# Altium schematic symbol library WR-TBL_Pluggable PCB Header.SchLib: 719 symbols (part 4 of 5) (continued)
## 691356310010B
designator P?
WR-TBL Serie 356B Double Level Horizontal PCB Header, Pluggable, pitch 3.81mm, 10p; Part Number: 691356310010B; Compliance: RoHS; Modularity: No; Pin Number: 10; Rated Current [UL]: 10A; Working Voltage [UL]: 300VAC; ComponentLink1Description: Manufacturer; ComponentLink1URL: http://www.we-online.de; ComponentLink2URL: https://katalog.we-online.de/em/datasheet/691356310010B.pdf; ComponentLink2Description: Datasheet; Mounting Technology: THT; Packaging: Box; Operating Temperature: -40 to +105degC; PCB/Cable/Panel: PCB; Pitch: 3.81mm; Published Date: October 2019; Type: Double Level Horizontal; Publisher: Wurth Elektronik; Application: Pluggable
footprint 691356310010B
pins: 1, 2, 3, 4, 5, 6, 7, 8, 9, 10

## 691356310012B
designator P?
WR-TBL Serie 356B Double Level Horizontal PCB Header, Pluggable, pitch 3.81mm, 12p; Part Number: 691356310012B; Compliance: RoHS; Modularity: No; Pin Number: 12; Rated Current [UL]: 10A; Working Voltage [UL]: 300VAC; ComponentLink1Description: Manufacturer; ComponentLink1URL: http://www.we-online.de; ComponentLink2URL: https://katalog.we-online.de/em/datasheet/691356310012B.pdf; ComponentLink2Description: Datasheet; Mounting Technology: THT; Packaging: Box; Operating Temperature: -40 to +105degC; PCB/Cable/Panel: PCB; Pitch: 3.81mm; Published Date: October 2019; Type: Double Level Horizontal; Publisher: Wurth Elektronik; Application: Pluggable
footprint 691356310012B
pins: 1, 2, 3, 4, 5, 6, 7, 8, 9, 10, 11, 12

## 691357300004B
designator P?
WR-TBL Serie 357B Double Level Vertical PCB Header with Flanges, Pluggable, pitch 3.81mm, 4p; Part Number: 691357300004B; Compliance: RoHS; Modularity: No; Pin Number: 4; Rated Current [UL]: 10A; Working Voltage [UL]: 300VAC; ComponentLink1Description: Manufacturer; ComponentLink1URL: http://www.we-online.de; ComponentLink2URL: https://katalog.we-online.de/em/datasheet/691357300004B.pdf; ComponentLink2Description: Datasheet; Mounting Technology: THT; Packaging: Box; Operating Temperature: -40 to +105degC; PCB/Cable/Panel: PCB; Pitch: 3.81mm; Published Date: October 2019; Type: Double Level Vertical; Publisher: Wurth Elektronik; Application: Pluggable
footprint 691357300004B
pins: 1, 2, 3, 4

## 691357300006B
designator P?
WR-TBL Serie 357B Double Level Vertical PCB Header with Flanges, Pluggable, pitch 3.81mm, 6p; Part Number: 691357300006B; Compliance: RoHS; Modularity: No; Pin Number: 6; Rated Current [UL]: 10A; Working Voltage [UL]: 300VAC; ComponentLink1Description: Manufacturer; ComponentLink1URL: http://www.we-online.de; ComponentLink2URL: https://katalog.we-online.de/em/datasheet/691357300006B.pdf; ComponentLink2Description: Datasheet; Mounting Technology: THT; Packaging: Box; Operating Temperature: -40 to +105degC; PCB/Cable/Panel: PCB; Pitch: 3.81mm; Published Date: October 2019; Type: Double Level Vertical; Publisher: Wurth Elektronik; Application: Pluggable
footprint 691357300006B
pins: 1, 2, 3, 4, 5, 6

## 691357300008B
designator P?
WR-TBL Serie 357B Double Level Vertical PCB Header with Flanges, Pluggable, pitch 3.81mm, 8p; Part Number: 691357300008B; Compliance: RoHS; Modularity: No; Pin Number: 8; Rated Current [UL]: 10A; Working Voltage [UL]: 300VAC; ComponentLink1Description: Manufacturer; ComponentLink1URL: http://www.we-online.de; ComponentLink2URL: https://katalog.we-online.de/em/datasheet/691357300008B.pdf; ComponentLink2Description: Datasheet; Mounting Technology: THT; Packaging: Box; Operating Temperature: -40 to +105degC; PCB/Cable/Panel: PCB; Pitch: 3.81mm; Published Date: October 2019; Type: Double Level Vertical; Publisher: Wurth Elektronik; Application: Pluggable
footprint 691357300008B
pins: 1, 2, 3, 4, 5, 6, 7, 8

## 691357300010B
designator P?
WR-TBL Serie 357B Double Level Vertical PCB Header with Flanges, Pluggable, pitch 3.81mm, 10p; Part Number: 691357300010B; Compliance: RoHS; Modularity: No; Pin Number: 10; Rated Current [UL]: 10A; Working Voltage [UL]: 300VAC; ComponentLink1Description: Manufacturer; ComponentLink1URL: http://www.we-online.de; ComponentLink2URL: https://katalog.we-online.de/em/datasheet/691357300010B.pdf; ComponentLink2Description: Datasheet; Mounting Technology: THT; Packaging: Box; Operating Temperature: -40 to +105degC; PCB/Cable/Panel: PCB; Pitch: 3.81mm; Published Date: October 2019; Type: Double Level Vertical; Publisher: Wurth Elektronik; Application: Pluggable
footprint 691357300010B
pins: 1, 2, 3, 4, 5, 6, 7, 8, 9, 10

## 691357300012B
designator P?
WR-TBL Serie 357B Double Level Vertical PCB Header with Flanges, Pluggable, pitch 3.81mm, 12p; Part Number: 691357300012B; Compliance: RoHS; Modularity: No; Pin Number: 12; Rated Current [UL]: 10A; Working Voltage [UL]: 300VAC; ComponentLink1Description: Manufacturer; ComponentLink1URL: http://www.we-online.de; ComponentLink2URL: https://katalog.we-online.de/em/datasheet/691357300012B.pdf; ComponentLink2Description: Datasheet; Mounting Technology: THT; Packaging: Box; Operating Temperature: -40 to +105degC; PCB/Cable/Panel: PCB; Pitch: 3.81mm; Published Date: October 2019; Type: Double Level Vertical; Publisher: Wurth Elektronik; Application: Pluggable
footprint 691357300012B
pins: 1, 2, 3, 4, 5, 6, 7, 8, 9, 10, 11, 12

## 691357310004B
designator P?
WR-TBL Serie 357B Double Level Horizontal PCB Header with Flanges, Pluggable, pitch 3.81mm, 4p; Part Number: 691357310004B; Compliance: RoHS; Modularity: No; Pin Number: 4; Rated Current [UL]: 10A; Working Voltage [UL]: 300VAC; ComponentLink1Description: Manufacturer; ComponentLink1URL: http://www.we-online.de; ComponentLink2URL: https://katalog.we-online.de/em/datasheet/691357310004B.pdf; ComponentLink2Description: Datasheet; Mounting Technology: THT; Packaging: Box; Operating Temperature: -40 to +105degC; PCB/Cable/Panel: PCB; Pitch: 3.81mm; Published Date: October 2019; Type: Double Level Horizontal; Publisher: Wurth Elektronik; Application: Pluggable
footprint 691357310004B
pins: 1, 2, 3, 4

## 691357310006B
designator P?
WR-TBL Serie 357B Double Level Horizontal PCB Header with Flanges, Pluggable, pitch 3.81mm, 6p; Part Number: 691357310006B; Compliance: RoHS; Modularity: No; Pin Number: 6; Rated Current [UL]: 10A; Working Voltage [UL]: 300VAC; ComponentLink1Description: Manufacturer; ComponentLink1URL: http://www.we-online.de; ComponentLink2URL: https://katalog.we-online.de/em/datasheet/691357310006B.pdf; ComponentLink2Description: Datasheet; Mounting Technology: THT; Packaging: Box; Operating Temperature: -40 to +105degC; PCB/Cable/Panel: PCB; Pitch: 3.81mm; Published Date: October 2019; Type: Double Level Horizontal; Publisher: Wurth Elektronik; Application: Pluggable
footprint 691357310006B
pins: 1, 2, 3, 4, 5, 6

## 691357310008B
designator P?
WR-TBL Serie 357B Double Level Horizontal PCB Header with Flanges, Pluggable, pitch 3.81mm, 8p; Part Number: 691357310008B; Compliance: RoHS; Modularity: No; Pin Number: 8; Rated Current [UL]: 10A; Working Voltage [UL]: 300VAC; ComponentLink1Description: Manufacturer; ComponentLink1URL: http://www.we-online.de; ComponentLink2URL: https://katalog.we-online.de/em/datasheet/691357310008B.pdf; ComponentLink2Description: Datasheet; Mounting Technology: THT; Packaging: Box; Operating Temperature: -40 to +105degC; PCB/Cable/Panel: PCB; Pitch: 3.81mm; Published Date: October 2019; Type: Double Level Horizontal; Publisher: Wurth Elektronik; Application: Pluggable
footprint 691357310008B
pins: 1, 2, 3, 4, 5, 6, 7, 8

## 691357310010B
designator P?
WR-TBL Serie 357B Double Level Horizontal PCB Header with Flanges, Pluggable, pitch 3.81mm, 10p; Part Number: 691357310010B; Compliance: RoHS; Modularity: No; Pin Number: 10; Rated Current [UL]: 10A; Working Voltage [UL]: 300VAC; ComponentLink1Description: Manufacturer; ComponentLink1URL: http://www.we-online.de; ComponentLink2URL: https://katalog.we-online.de/em/datasheet/691357310010B.pdf; ComponentLink2Description: Datasheet; Mounting Technology: THT; Packaging: Box; Operating Temperature: -40 to +105degC; PCB/Cable/Panel: PCB; Pitch: 3.81mm; Published Date: October 2019; Type: Double Level Horizontal; Publisher: Wurth Elektronik; Application: Pluggable
footprint 691357310010B
pins: 1, 2, 3, 4, 5, 6, 7, 8, 9, 10

## 691357310012B
designator P?
WR-TBL Serie 357B Double Level Horizontal PCB Header with Flanges, Pluggable, pitch 3.81mm, 12p; Part Number: 691357310012B; Compliance: RoHS; Modularity: No; Pin Number: 12; Rated Current [UL]: 10A; Working Voltage [UL]: 300VAC; ComponentLink1Description: Manufacturer; ComponentLink1URL: http://www.we-online.de; ComponentLink2URL: https://katalog.we-online.de/em/datasheet/691357310012B.pdf; ComponentLink2Description: Datasheet; Mounting Technology: THT; Packaging: Box; Operating Temperature: -40 to +105degC; PCB/Cable/Panel: PCB; Pitch: 3.81mm; Published Date: October 2019; Type: Double Level Horizontal; Publisher: Wurth Elektronik; Application: Pluggable
footprint 691357310012B
pins: 1, 2, 3, 4, 5, 6, 7, 8, 9, 10, 11, 12

## 691370710002B
designator P?
WR-TBL Serie 370B Horizontal PCB Header, Pluggable, pitch 5mm, 2p; Part Number: 691370710002B; Compliance: RoHS; Modularity: No; Pin Number: 2; Rated Current [UL]: 16A; Working Voltage [UL]: 300VAC; ComponentLink1Description: Manufacturer; ComponentLink1URL: http://www.we-online.de; ComponentLink2URL: https://katalog.we-online.de/em/datasheet/691370710002B.pdf; ComponentLink2Description: Datasheet; Mounting Technology: THT; Packaging: Box; Operating Temperature: -40 to +105degC; PCB/Cable/Panel: PCB; Pitch: 5mm; Published Date: October 2019; Type: Horizontal; Publisher: Wurth Elektronik; Application: Pluggable
footprint 691370710002B
pins: 1, 2

## 691370710003B
designator P?
WR-TBL Serie 370B Horizontal PCB Header, Pluggable, pitch 5mm, 3p; Part Number: 691370710003B; Compliance: RoHS; Modularity: No; Pin Number: 3; Rated Current [UL]: 16A; Working Voltage [UL]: 300VAC; ComponentLink1Description: Manufacturer; ComponentLink1URL: http://www.we-online.de; ComponentLink2URL: https://katalog.we-online.de/em/datasheet/691370710003B.pdf; ComponentLink2Description: Datasheet; Mounting Technology: THT; Packaging: Box; Operating Temperature: -40 to +105degC; PCB/Cable/Panel: PCB; Pitch: 5mm; Published Date: October 2019; Type: Horizontal; Publisher: Wurth Elektronik; Application: Pluggable
footprint 691370710003B
pins: 1, 2, 3

## 691370710004B
designator P?
WR-TBL Serie 370B Horizontal PCB Header, Pluggable, pitch 5mm, 4p; Part Number: 691370710004B; Compliance: RoHS; Modularity: No; Pin Number: 4; Rated Current [UL]: 16A; Working Voltage [UL]: 300VAC; ComponentLink1Description: Manufacturer; ComponentLink1URL: http://www.we-online.de; ComponentLink2URL: https://katalog.we-online.de/em/datasheet/691370710004B.pdf; ComponentLink2Description: Datasheet; Mounting Technology: THT; Packaging: Box; Operating Temperature: -40 to +105degC; PCB/Cable/Panel: PCB; Pitch: 5mm; Published Date: October 2019; Type: Horizontal; Publisher: Wurth Elektronik; Application: Pluggable
footprint 691370710004B
pins: 1, 2, 3, 4

## 691370710005B
designator P?
WR-TBL Serie 370B Horizontal PCB Header, Pluggable, pitch 5mm, 5p; Part Number: 691370710005B; Compliance: RoHS; Modularity: No; Pin Number: 5; Rated Current [UL]: 16A; Working Voltage [UL]: 300VAC; ComponentLink1Description: Manufacturer; ComponentLink1URL: http://www.we-online.de; ComponentLink2URL: https://katalog.we-online.de/em/datasheet/691370710005B.pdf; ComponentLink2Description: Datasheet; Mounting Technology: THT; Packaging: Box; Operating Temperature: -40 to +105degC; PCB/Cable/Panel: PCB; Pitch: 5mm; Published Date: October 2019; Type: Horizontal; Publisher: Wurth Elektronik; Application: Pluggable
footprint 691370710005B
pins: 1, 2, 3, 4, 5

## 691370710006B
designator P?
WR-TBL Serie 370B Horizontal PCB Header, Pluggable, pitch 5mm, 6p; Part Number: 691370710006B; Compliance: RoHS; Modularity: No; Pin Number: 6; Rated Current [UL]: 16A; Working Voltage [UL]: 300VAC; ComponentLink1Description: Manufacturer; ComponentLink1URL: http://www.we-online.de; ComponentLink2URL: https://katalog.we-online.de/em/datasheet/691370710006B.pdf; ComponentLink2Description: Datasheet; Mounting Technology: THT; Packaging: Box; Operating Temperature: -40 to +105degC; PCB/Cable/Panel: PCB; Pitch: 5mm; Published Date: October 2019; Type: Horizontal; Publisher: Wurth Elektronik; Application: Pluggable
footprint 691370710006B
pins: 1, 2, 3, 4, 5, 6

## 691370710007B
designator P?
WR-TBL Serie 370B Horizontal PCB Header, Pluggable, pitch 5mm, 7p; Part Number: 691370710007B; Compliance: RoHS; Modularity: No; Pin Number: 7; Rated Current [UL]: 16A; Working Voltage [UL]: 300VAC; ComponentLink1Description: Manufacturer; ComponentLink1URL: http://www.we-online.de; ComponentLink2URL: https://katalog.we-online.de/em/datasheet/691370710007B.pdf; ComponentLink2Description: Datasheet; Mounting Technology: THT; Packaging: Box; Operating Temperature: -40 to +105degC; PCB/Cable/Panel: PCB; Pitch: 5mm; Published Date: October 2019; Type: Horizontal; Publisher: Wurth Elektronik; Application: Pluggable
footprint 691370710007B
pins: 1, 2, 3, 4, 5, 6, 7

## 691370710008B
designator P?
WR-TBL Serie 370B Horizontal PCB Header, Pluggable, pitch 5mm, 8p; Part Number: 691370710008B; Compliance: RoHS; Modularity: No; Pin Number: 8; Rated Current [UL]: 16A; Working Voltage [UL]: 300VAC; ComponentLink1Description: Manufacturer; ComponentLink1URL: http://www.we-online.de; ComponentLink2URL: https://katalog.we-online.de/em/datasheet/691370710008B.pdf; ComponentLink2Description: Datasheet; Mounting Technology: THT; Packaging: Box; Operating Temperature: -40 to +105degC; PCB/Cable/Panel: PCB; Pitch: 5mm; Published Date: October 2019; Type: Horizontal; Publisher: Wurth Elektronik; Application: Pluggable
footprint 691370710008B
pins: 1, 2, 3, 4, 5, 6, 7, 8

## 691370710012B
designator P?
WR-TBL Serie 370B Horizontal PCB Header, Pluggable, pitch 5mm, 12p; Part Number: 691370710012B; Compliance: RoHS; Modularity: No; Pin Number: 12; Rated Current [UL]: 16A; Working Voltage [UL]: 300VAC; ComponentLink1Description: Manufacturer; ComponentLink1URL: http://www.we-online.de; ComponentLink2URL: https://katalog.we-online.de/em/datasheet/691370710012B.pdf; ComponentLink2Description: Datasheet; Mounting Technology: THT; Packaging: Box; Operating Temperature: -40 to +105degC; PCB/Cable/Panel: PCB; Pitch: 5mm; Published Date: October 2019; Type: Horizontal; Publisher: Wurth Elektronik; Application: Pluggable
footprint 691370710012B
pins: 1, 2, 3, 4, 5, 6, 7, 8, 9, 10, 11, 12

## 691371700002B
designator P?
WR-TBL Serie 371B Vertical PCB Header, Pluggable, pitch 5mm, 2p; Part Number: 691371700002B; Compliance: RoHS; Modularity: No; Pin Number: 2; Rated Current [UL]: 16A; Working Voltage [UL]: 300VAC; ComponentLink1Description: Manufacturer; ComponentLink1URL: http://www.we-online.de; ComponentLink2URL: https://katalog.we-online.de/em/datasheet/691371700002B.pdf; ComponentLink2Description: Datasheet; Mounting Technology: THT; Packaging: Box; Operating Temperature: -40 to +105degC; PCB/Cable/Panel: PCB; Pitch: 5mm; Published Date: October 2019; Type: Vertical; Publisher: Wurth Elektronik; Application: Pluggable
footprint 691371700002B
pins: 1, 2

## 691371700003B
designator P?
WR-TBL Serie 371B Vertical PCB Header, Pluggable, pitch 5mm, 3p; Part Number: 691371700003B; Compliance: RoHS; Modularity: No; Pin Number: 3; Rated Current [UL]: 16A; Working Voltage [UL]: 300VAC; ComponentLink1Description: Manufacturer; ComponentLink1URL: http://www.we-online.de; ComponentLink2URL: https://katalog.we-online.de/em/datasheet/691371700003B.pdf; ComponentLink2Description: Datasheet; Mounting Technology: THT; Packaging: Box; Operating Temperature: -40 to +105degC; PCB/Cable/Panel: PCB; Pitch: 5mm; Published Date: October 2019; Type: Vertical; Publisher: Wurth Elektronik; Application: Pluggable
footprint 691371700003B
pins: 1, 2, 3

## 691371700004B
designator P?
WR-TBL Serie 371B Vertical PCB Header, Pluggable, pitch 5mm, 4p; Part Number: 691371700004B; Compliance: RoHS; Modularity: No; Pin Number: 4; Rated Current [UL]: 16A; Working Voltage [UL]: 300VAC; ComponentLink1Description: Manufacturer; ComponentLink1URL: http://www.we-online.de; ComponentLink2URL: https://katalog.we-online.de/em/datasheet/691371700004B.pdf; ComponentLink2Description: Datasheet; Mounting Technology: THT; Packaging: Box; Operating Temperature: -40 to +105degC; PCB/Cable/Panel: PCB; Pitch: 5mm; Published Date: October 2019; Type: Vertical; Publisher: Wurth Elektronik; Application: Pluggable
footprint 691371700004B
pins: 1, 2, 3, 4

## 691371700005B
designator P?
WR-TBL Serie 371B Vertical PCB Header, Pluggable, pitch 5mm, 5p; Part Number: 691371700005B; Compliance: RoHS; Modularity: No; Pin Number: 5; Rated Current [UL]: 16A; Working Voltage [UL]: 300VAC; ComponentLink1Description: Manufacturer; ComponentLink1URL: http://www.we-online.de; ComponentLink2URL: https://katalog.we-online.de/em/datasheet/691371700005B.pdf; ComponentLink2Description: Datasheet; Mounting Technology: THT; Packaging: Box; Operating Temperature: -40 to +105degC; PCB/Cable/Panel: PCB; Pitch: 5mm; Published Date: October 2019; Type: Vertical; Publisher: Wurth Elektronik; Application: Pluggable
footprint 691371700005B
pins: 1, 2, 3, 4, 5

## 691371700006B
designator P?
WR-TBL Serie 371B Vertical PCB Header, Pluggable, pitch 5mm, 6p; Part Number: 691371700006B; Compliance: RoHS; Modularity: No; Pin Number: 6; Rated Current [UL]: 16A; Working Voltage [UL]: 300VAC; ComponentLink1Description: Manufacturer; ComponentLink1URL: http://www.we-online.de; ComponentLink2URL: https://katalog.we-online.de/em/datasheet/691371700006B.pdf; ComponentLink2Description: Datasheet; Mounting Technology: THT; Packaging: Box; Operating Temperature: -40 to +105degC; PCB/Cable/Panel: PCB; Pitch: 5mm; Published Date: October 2019; Type: Vertical; Publisher: Wurth Elektronik; Application: Pluggable
footprint 691371700006B
pins: 1, 2, 3, 4, 5, 6

## 691371700007B
designator P?
WR-TBL Serie 371B Vertical PCB Header, Pluggable, pitch 5mm, 7p; Part Number: 691371700007B; Compliance: RoHS; Modularity: No; Pin Number: 7; Rated Current [UL]: 16A; Working Voltage [UL]: 300VAC; ComponentLink1Description: Manufacturer; ComponentLink1URL: http://www.we-online.de; ComponentLink2URL: https://katalog.we-online.de/em/datasheet/691371700007B.pdf; ComponentLink2Description: Datasheet; Mounting Technology: THT; Packaging: Box; Operating Temperature: -40 to +105degC; PCB/Cable/Panel: PCB; Pitch: 5mm; Published Date: October 2019; Type: Vertical; Publisher: Wurth Elektronik; Application: Pluggable
footprint 691371700007B
pins: 1, 2, 3, 4, 5, 6, 7

## 691371700008B
designator P?
WR-TBL Serie 371B Vertical PCB Header, Pluggable, pitch 5mm, 8p; Part Number: 691371700008B; Compliance: RoHS; Modularity: No; Pin Number: 8; Rated Current [UL]: 16A; Working Voltage [UL]: 300VAC; ComponentLink1Description: Manufacturer; ComponentLink1URL: http://www.we-online.de; ComponentLink2URL: https://katalog.we-online.de/em/datasheet/691371700008B.pdf; ComponentLink2Description: Datasheet; Mounting Technology: THT; Packaging: Box; Operating Temperature: -40 to +105degC; PCB/Cable/Panel: PCB; Pitch: 5mm; Published Date: October 2019; Type: Vertical; Publisher: Wurth Elektronik; Application: Pluggable
footprint 691371700008B
pins: 1, 2, 3, 4, 5, 6, 7, 8

## 691371700012B
designator P?
WR-TBL Serie 371B Vertical PCB Header, Pluggable, pitch 5mm, 12p; Part Number: 691371700012B; Compliance: RoHS; Modularity: No; Pin Number: 12; Rated Current [UL]: 16A; Working Voltage [UL]: 300VAC; ComponentLink1Description: Manufacturer; ComponentLink1URL: http://www.we-online.de; ComponentLink2URL: https://katalog.we-online.de/em/datasheet/691371700012B.pdf; ComponentLink2Description: Datasheet; Mounting Technology: THT; Packaging: Box; Operating Temperature: -40 to +105degC; PCB/Cable/Panel: PCB; Pitch: 5mm; Published Date: October 2019; Type: Vertical; Publisher: Wurth Elektronik; Application: Pluggable
footprint 691371700012B
pins: 1, 2, 3, 4, 5, 6, 7, 8, 9, 10, 11, 12

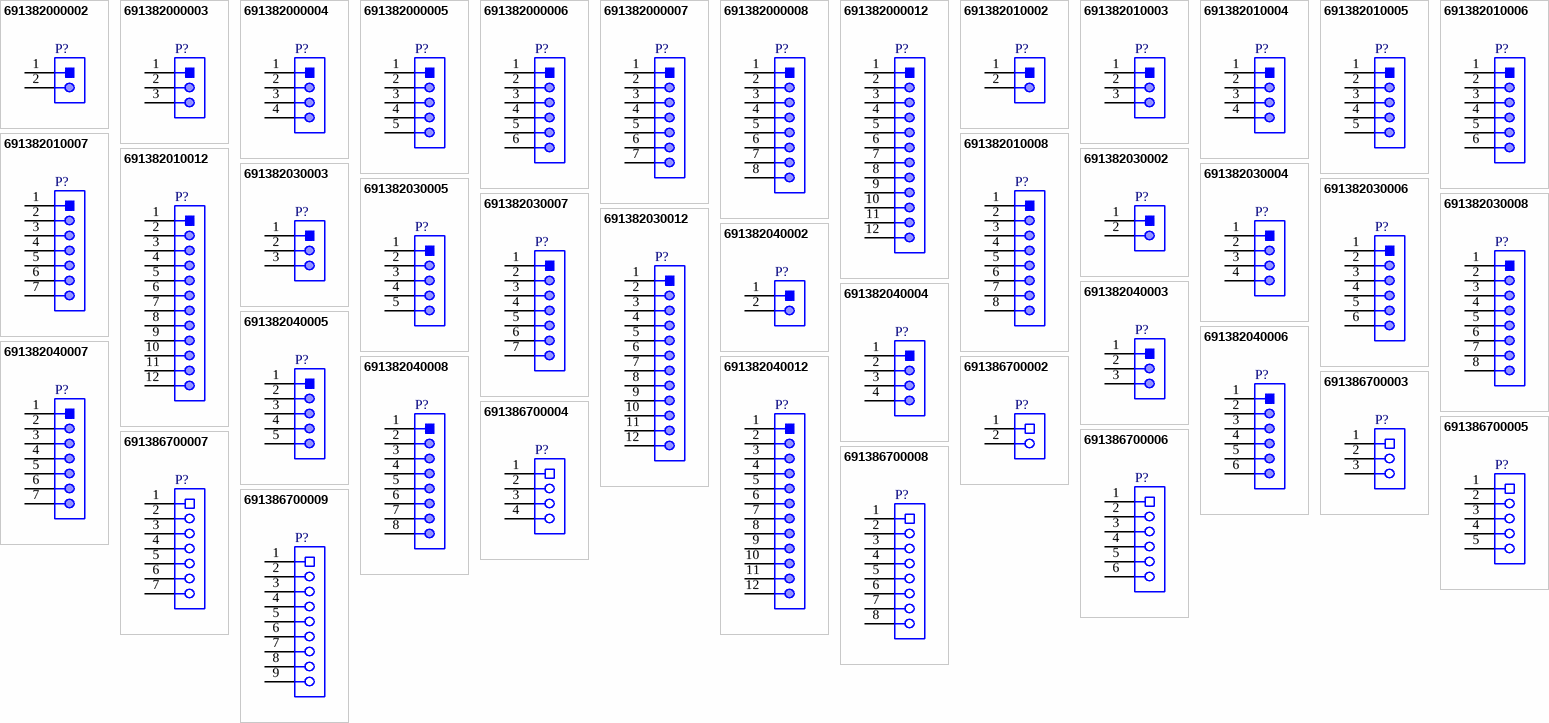
[diagram p14: symbols 691382000002 to 691386700009]

## 691382000002
designator P?
WR-TBL Serie 382 Vertical PCB Header, Pluggable, pitch 2.5mm, 2p; Part Number: 691382000002; Compliance: RoHS; Modularity: No; Pin Number: 2; Rated Current [UL]: 12A; Working Voltage [UL]: 300VAC; ComponentLink1Description: Manufacturer; ComponentLink1URL: http://www.we-online.de; ComponentLink2URL: https://katalog.we-online.de/em/datasheet/691382000002.pdf; ComponentLink2Description: Datasheet; Mounting Technology: THT; Packaging: Box; Operating Temperature: -40 to +105degC; PCB/Cable/Panel: PCB; Pitch: 2.5mm; Published Date: October 2019; Type: Vertical; Publisher: Wurth Elektronik; Application: Pluggable
footprint 691382000002
pins: 1, 2

## 691382000003
designator P?
WR-TBL Serie 382 Vertical PCB Header, Pluggable, pitch 2.5mm, 3p; Part Number: 691382000003; Compliance: RoHS; Modularity: No; Pin Number: 3; Rated Current [UL]: 12A; Working Voltage [UL]: 300VAC; ComponentLink1Description: Manufacturer; ComponentLink1URL: http://www.we-online.de; ComponentLink2URL: https://katalog.we-online.de/em/datasheet/691382000003.pdf; ComponentLink2Description: Datasheet; Mounting Technology: THT; Packaging: Box; Operating Temperature: -40 to +105degC; PCB/Cable/Panel: PCB; Pitch: 2.5mm; Published Date: October 2019; Type: Vertical; Publisher: Wurth Elektronik; Application: Pluggable
footprint 691382000003
pins: 1, 2, 3

## 691382000004
designator P?
WR-TBL Serie 382 Vertical PCB Header, Pluggable, pitch 2.5mm, 4p; Part Number: 691382000004; Compliance: RoHS; Modularity: No; Pin Number: 4; Rated Current [UL]: 12A; Working Voltage [UL]: 300VAC; ComponentLink1Description: Manufacturer; ComponentLink1URL: http://www.we-online.de; ComponentLink2URL: https://katalog.we-online.de/em/datasheet/691382000004.pdf; ComponentLink2Description: Datasheet; Mounting Technology: THT; Packaging: Box; Operating Temperature: -40 to +105degC; PCB/Cable/Panel: PCB; Pitch: 2.5mm; Published Date: October 2019; Type: Vertical; Publisher: Wurth Elektronik; Application: Pluggable
footprint 691382000004
pins: 1, 2, 3, 4

## 691382000005
designator P?
WR-TBL Serie 382 Vertical PCB Header, Pluggable, pitch 2.5mm, 5p; Part Number: 691382000005; Compliance: RoHS; Modularity: No; Pin Number: 5; Rated Current [UL]: 12A; Working Voltage [UL]: 300VAC; ComponentLink1Description: Manufacturer; ComponentLink1URL: http://www.we-online.de; ComponentLink2URL: https://katalog.we-online.de/em/datasheet/691382000005.pdf; ComponentLink2Description: Datasheet; Mounting Technology: THT; Packaging: Box; Operating Temperature: -40 to +105degC; PCB/Cable/Panel: PCB; Pitch: 2.5mm; Published Date: October 2019; Type: Vertical; Publisher: Wurth Elektronik; Application: Pluggable
footprint 691382000005
pins: 1, 2, 3, 4, 5

## 691382000006
designator P?
WR-TBL Serie 382 Vertical PCB Header, Pluggable, pitch 2.5mm, 6p; Part Number: 691382000006; Compliance: RoHS; Modularity: No; Pin Number: 6; Rated Current [UL]: 12A; Working Voltage [UL]: 300VAC; ComponentLink1Description: Manufacturer; ComponentLink1URL: http://www.we-online.de; ComponentLink2URL: https://katalog.we-online.de/em/datasheet/691382000006.pdf; ComponentLink2Description: Datasheet; Mounting Technology: THT; Packaging: Box; Operating Temperature: -40 to +105degC; PCB/Cable/Panel: PCB; Pitch: 2.5mm; Published Date: October 2019; Type: Vertical; Publisher: Wurth Elektronik; Application: Pluggable
footprint 691382000006
pins: 1, 2, 3, 4, 5, 6

## 691382000007
designator P?
WR-TBL Serie 382 Vertical PCB Header, Pluggable, pitch 2.5mm, 7p; Part Number: 691382000007; Compliance: RoHS; Modularity: No; Pin Number: 7; Rated Current [UL]: 12A; Working Voltage [UL]: 300VAC; ComponentLink1Description: Manufacturer; ComponentLink1URL: http://www.we-online.de; ComponentLink2URL: https://katalog.we-online.de/em/datasheet/691382000007.pdf; ComponentLink2Description: Datasheet; Mounting Technology: THT; Packaging: Box; Operating Temperature: -40 to +105degC; PCB/Cable/Panel: PCB; Pitch: 2.5mm; Published Date: October 2019; Type: Vertical; Publisher: Wurth Elektronik; Application: Pluggable
footprint 691382000007
pins: 1, 2, 3, 4, 5, 6, 7

## 691382000008
designator P?
WR-TBL Serie 382 Vertical PCB Header, Pluggable, pitch 2.5mm, 8p; Part Number: 691382000008; Compliance: RoHS; Modularity: No; Pin Number: 8; Rated Current [UL]: 12A; Working Voltage [UL]: 300VAC; ComponentLink1Description: Manufacturer; ComponentLink1URL: http://www.we-online.de; ComponentLink2URL: https://katalog.we-online.de/em/datasheet/691382000008.pdf; ComponentLink2Description: Datasheet; Mounting Technology: THT; Packaging: Box; Operating Temperature: -40 to +105degC; PCB/Cable/Panel: PCB; Pitch: 2.5mm; Published Date: October 2019; Type: Vertical; Publisher: Wurth Elektronik; Application: Pluggable
footprint 691382000008
pins: 1, 2, 3, 4, 5, 6, 7, 8

## 691382000012
designator P?
WR-TBL Serie 382 Vertical PCB Header, Pluggable, pitch 2.5mm, 12p; Part Number: 691382000012; Compliance: RoHS; Modularity: No; Pin Number: 12; Rated Current [UL]: 12A; Working Voltage [UL]: 300VAC; ComponentLink1Description: Manufacturer; ComponentLink1URL: http://www.we-online.de; ComponentLink2URL: https://katalog.we-online.de/em/datasheet/691382000012.pdf; ComponentLink2Description: Datasheet; Mounting Technology: THT; Packaging: Box; Operating Temperature: -40 to +105degC; PCB/Cable/Panel: PCB; Pitch: 2.5mm; Published Date: October 2019; Type: Vertical; Publisher: Wurth Elektronik; Application: Pluggable
footprint 691382000012
pins: 1, 2, 3, 4, 5, 6, 7, 8, 9, 10, 11, 12

## 691382010002
designator P?
WR-TBL Serie 382 Horizontal PCB Header, Pluggable, pitch 2.5mm, 2p; Part Number: 691382010002; Compliance: RoHS; Modularity: No; Pin Number: 2; Rated Current [UL]: 12A; Working Voltage [UL]: 300VAC; ComponentLink1Description: Manufacturer; ComponentLink1URL: http://www.we-online.de; ComponentLink2URL: https://katalog.we-online.de/em/datasheet/691382010002.pdf; ComponentLink2Description: Datasheet; Mounting Technology: THT; Packaging: Box; Operating Temperature: -40 to +105degC; PCB/Cable/Panel: PCB; Pitch: 2.5mm; Published Date: October 2019; Type: Horizontal; Publisher: Wurth Elektronik; Application: Pluggable
footprint 691382010002
pins: 1, 2

## 691382010003
designator P?
WR-TBL Serie 382 Horizontal PCB Header, Pluggable, pitch 2.5mm, 3p; Part Number: 691382010003; Compliance: RoHS; Modularity: No; Pin Number: 3; Rated Current [UL]: 12A; Working Voltage [UL]: 300VAC; ComponentLink1Description: Manufacturer; ComponentLink1URL: http://www.we-online.de; ComponentLink2URL: https://katalog.we-online.de/em/datasheet/691382010003.pdf; ComponentLink2Description: Datasheet; Mounting Technology: THT; Packaging: Box; Operating Temperature: -40 to +105degC; PCB/Cable/Panel: PCB; Pitch: 2.5mm; Published Date: October 2019; Type: Horizontal; Publisher: Wurth Elektronik; Application: Pluggable
footprint 691382010003
pins: 1, 2, 3

## 691382010004
designator P?
WR-TBL Serie 382 Horizontal PCB Header, Pluggable, pitch 2.5mm, 4p; Part Number: 691382010004; Compliance: RoHS; Modularity: No; Pin Number: 4; Rated Current [UL]: 12A; Working Voltage [UL]: 300VAC; ComponentLink1Description: Manufacturer; ComponentLink1URL: http://www.we-online.de; ComponentLink2URL: https://katalog.we-online.de/em/datasheet/691382010004.pdf; ComponentLink2Description: Datasheet; Mounting Technology: THT; Packaging: Box; Operating Temperature: -40 to +105degC; PCB/Cable/Panel: PCB; Pitch: 2.5mm; Published Date: October 2019; Type: Horizontal; Publisher: Wurth Elektronik; Application: Pluggable
footprint 691382010004
pins: 1, 2, 3, 4

## 691382010005
designator P?
WR-TBL Serie 382 Horizontal PCB Header, Pluggable, pitch 2.5mm, 5p; Part Number: 691382010005; Compliance: RoHS; Modularity: No; Pin Number: 5; Rated Current [UL]: 12A; Working Voltage [UL]: 300VAC; ComponentLink1Description: Manufacturer; ComponentLink1URL: http://www.we-online.de; ComponentLink2URL: https://katalog.we-online.de/em/datasheet/691382010005.pdf; ComponentLink2Description: Datasheet; Mounting Technology: THT; Packaging: Box; Operating Temperature: -40 to +105degC; PCB/Cable/Panel: PCB; Pitch: 2.5mm; Published Date: October 2019; Type: Horizontal; Publisher: Wurth Elektronik; Application: Pluggable
footprint 691382010005
pins: 1, 2, 3, 4, 5

## 691382010006
designator P?
WR-TBL Serie 382 Horizontal PCB Header, Pluggable, pitch 2.5mm, 6p; Part Number: 691382010006; Compliance: RoHS; Modularity: No; Pin Number: 6; Rated Current [UL]: 12A; Working Voltage [UL]: 300VAC; ComponentLink1Description: Manufacturer; ComponentLink1URL: http://www.we-online.de; ComponentLink2URL: https://katalog.we-online.de/em/datasheet/691382010006.pdf; ComponentLink2Description: Datasheet; Mounting Technology: THT; Packaging: Box; Operating Temperature: -40 to +105degC; PCB/Cable/Panel: PCB; Pitch: 2.5mm; Published Date: October 2019; Type: Horizontal; Publisher: Wurth Elektronik; Application: Pluggable
footprint 691382010006
pins: 1, 2, 3, 4, 5, 6

## 691382010007
designator P?
WR-TBL Serie 382 Horizontal PCB Header, Pluggable, pitch 2.5mm, 7p; Part Number: 691382010007; Compliance: RoHS; Modularity: No; Pin Number: 7; Rated Current [UL]: 12A; Working Voltage [UL]: 300VAC; ComponentLink1Description: Manufacturer; ComponentLink1URL: http://www.we-online.de; ComponentLink2URL: https://katalog.we-online.de/em/datasheet/691382010007.pdf; ComponentLink2Description: Datasheet; Mounting Technology: THT; Packaging: Box; Operating Temperature: -40 to +105degC; PCB/Cable/Panel: PCB; Pitch: 2.5mm; Published Date: October 2019; Type: Horizontal; Publisher: Wurth Elektronik; Application: Pluggable
footprint 691382010007
pins: 1, 2, 3, 4, 5, 6, 7

## 691382010008
designator P?
WR-TBL Serie 382 Horizontal PCB Header, Pluggable, pitch 2.5mm, 8p; Part Number: 691382010008; Compliance: RoHS; Modularity: No; Pin Number: 8; Rated Current [UL]: 12A; Working Voltage [UL]: 300VAC; ComponentLink1Description: Manufacturer; ComponentLink1URL: http://www.we-online.de; ComponentLink2URL: https://katalog.we-online.de/em/datasheet/691382010008.pdf; ComponentLink2Description: Datasheet; Mounting Technology: THT; Packaging: Box; Operating Temperature: -40 to +105degC; PCB/Cable/Panel: PCB; Pitch: 2.5mm; Published Date: October 2019; Type: Horizontal; Publisher: Wurth Elektronik; Application: Pluggable
footprint 691382010008
pins: 1, 2, 3, 4, 5, 6, 7, 8
